# Altium footprint library 2.54插件排母.PcbLib: 74 footprints (part 5 of 5)
Each footprint in its own frame and in the unit in brackets; x right, y up, seen from the top. Pads: shape width x height; smd on the part's side, far side on the other; paste and mask are expansions set on the pad; w line width, h text height; cw(c..) or ccw(c..) is an arc to the next point about the centre after c.
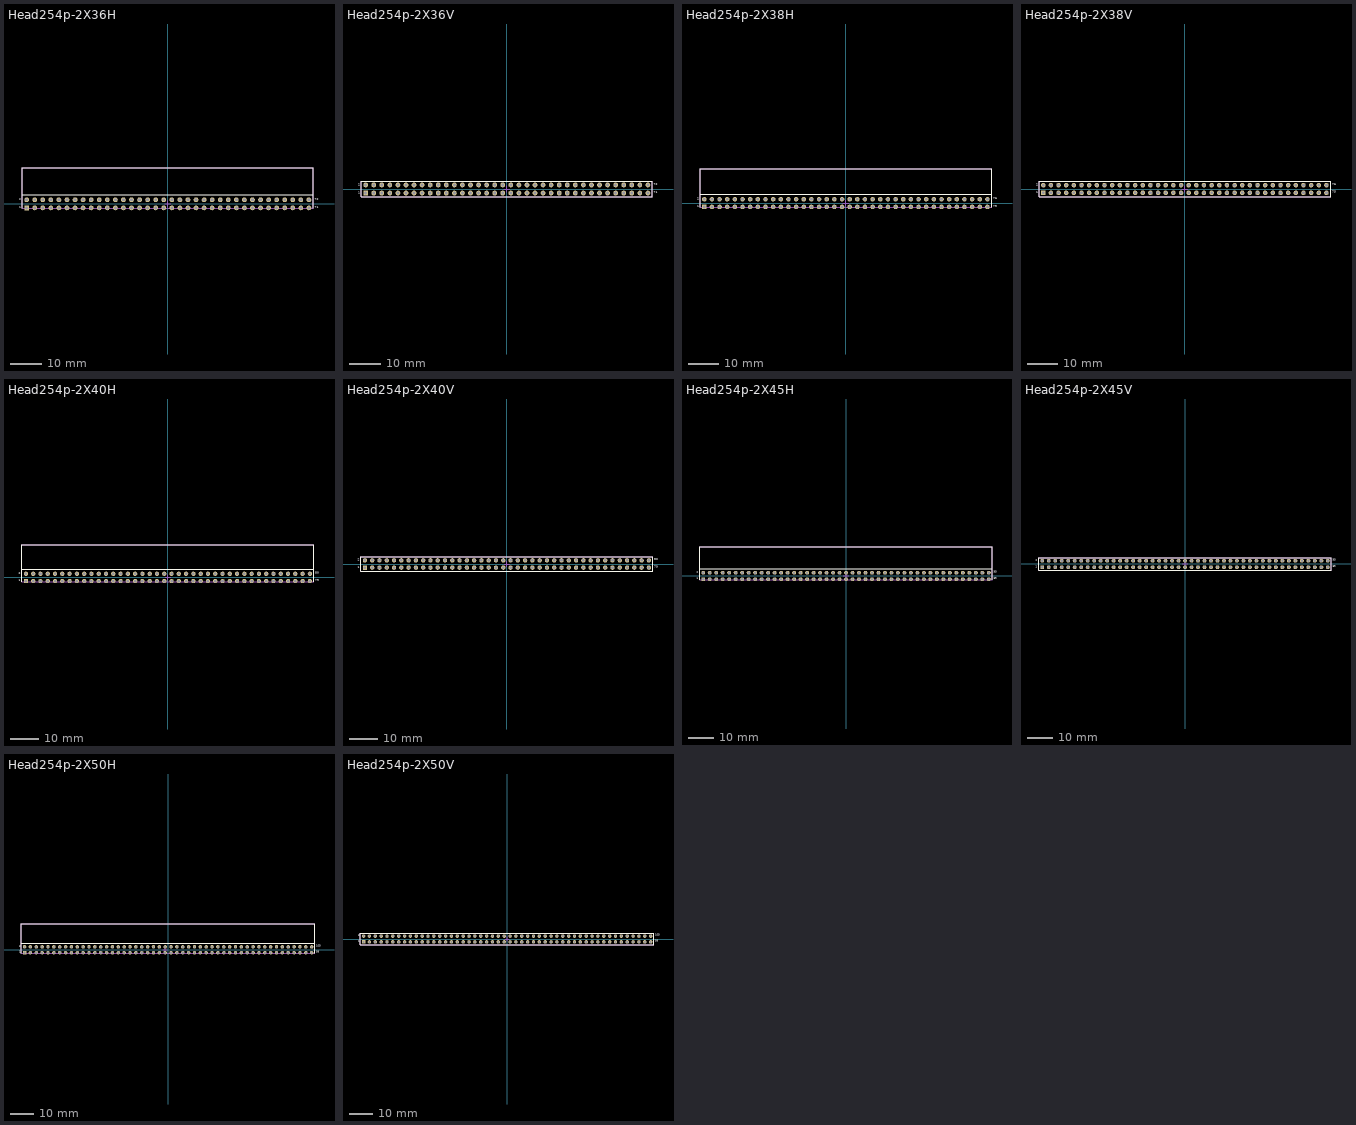
[diagram p4: the footprints below, top view; thin cyan lines are the x and y axes]

## Head254p-2X36H [mm] "2.54脚距 90度 插件 双排母"
height 5
pads (72):
  rect 1.5x1.5 hole 0.9: 1(-44.45,-1.27)
  round 1.5 hole 0.9: 2(-44.45,1.27) 3(-41.91,-1.27) 4(-41.91,1.27) 5(-39.37,-1.27) 6(-39.37,1.27) 7(-36.83,-1.27) 8(-36.83,1.27) 9(-34.29,-1.27) 10(-34.29,1.27) 11(-31.75,-1.27) 12(-31.75,1.27) 13(-29.21,-1.27) 14(-29.21,1.27) 15(-26.67,-1.27) 16(-26.67,1.27) 17(-24.13,-1.27) 18(-24.13,1.27) 19(-21.59,-1.27) 20(-21.59,1.27) 21(-19.05,-1.27) 22(-19.05,1.27) 23(-16.51,-1.27) 24(-16.51,1.27) 25(-13.97,-1.27) 26(-13.97,1.27) 27(-11.43,-1.27) 28(-11.43,1.27) 29(-8.89,-1.27) 30(-8.89,1.27) 31(-6.35,-1.27) 32(-6.35,1.27) 33(-3.81,-1.27) 34(-3.81,1.27) 35(-1.27,-1.27) 36(-1.27,1.27) 37(1.27,-1.27) 38(1.27,1.27) 39(3.81,-1.27) 40(3.81,1.27) 41(6.35,-1.27) 42(6.35,1.27) 43(8.89,-1.27) 44(8.89,1.27) 45(11.43,-1.27) 46(11.43,1.27) 47(13.97,-1.27) 48(13.97,1.27) 49(16.51,-1.27) 50(16.51,1.27) 51(19.05,-1.27) 52(19.05,1.27) 53(21.59,-1.27) 54(21.59,1.27) 55(24.13,-1.27) 56(24.13,1.27) 57(26.67,-1.27) 58(26.67,1.27) 59(29.21,-1.27) 60(29.21,1.27) 61(31.75,-1.27) 62(31.75,1.27) 63(34.29,-1.27) 64(34.29,1.27) 65(36.83,-1.27) 66(36.83,1.27) 67(39.37,-1.27) 68(39.37,1.27) 69(41.91,-1.27) 70(41.91,1.27) 71(44.45,-1.27) 72(44.45,1.27)
Top Overlay:
  lines w0.254: -45.82,-1.43 -45.82,11.37 45.82,11.37 45.82,-1.43 ; -45.82,2.87 45.82,2.87
  text "2" at -46.863,0.762 h1.27
  text "1" at -46.863,-1.778 h1.27
  text "71" at 46.355,-1.651 h1.27
  text "72" at 46.355,0.889 h1.27
Mechanical 13:
  lines w0.1: -45.82,-1.43 -45.82,11.37 45.82,11.37 45.82,-1.43 -45.82,-1.43
Mechanical 15:
  lines w0.1: -1,0 1,0 ; 0,-1 0,1
3D body: height 5.04, standoff -2.35, extent -45.82,-1.43 45.82,11.37

## Head254p-2X36V [mm] "2.54脚距 180度 插件 双排母"
height 9
pads (72):
  rect 1.5x1.5 hole 0.9: 1(-44.45,-1.27)
  round 1.5 hole 0.9: 2(-44.45,1.27) 3(-41.91,-1.27) 4(-41.91,1.27) 5(-39.37,-1.27) 6(-39.37,1.27) 7(-36.83,-1.27) 8(-36.83,1.27) 9(-34.29,-1.27) 10(-34.29,1.27) 11(-31.75,-1.27) 12(-31.75,1.27) 13(-29.21,-1.27) 14(-29.21,1.27) 15(-26.67,-1.27) 16(-26.67,1.27) 17(-24.13,-1.27) 18(-24.13,1.27) 19(-21.59,-1.27) 20(-21.59,1.27) 21(-19.05,-1.27) 22(-19.05,1.27) 23(-16.51,-1.27) 24(-16.51,1.27) 25(-13.97,-1.27) 26(-13.97,1.27) 27(-11.43,-1.27) 28(-11.43,1.27) 29(-8.89,-1.27) 30(-8.89,1.27) 31(-6.35,-1.27) 32(-6.35,1.27) 33(-3.81,-1.27) 34(-3.81,1.27) 35(-1.27,-1.27) 36(-1.27,1.27) 37(1.27,-1.27) 38(1.27,1.27) 39(3.81,-1.27) 40(3.81,1.27) 41(6.35,-1.27) 42(6.35,1.27) 43(8.89,-1.27) 44(8.89,1.27) 45(11.43,-1.27) 46(11.43,1.27) 47(13.97,-1.27) 48(13.97,1.27) 49(16.51,-1.27) 50(16.51,1.27) 51(19.05,-1.27) 52(19.05,1.27) 53(21.59,-1.27) 54(21.59,1.27) 55(24.13,-1.27) 56(24.13,1.27) 57(26.67,-1.27) 58(26.67,1.27) 59(29.21,-1.27) 60(29.21,1.27) 61(31.75,-1.27) 62(31.75,1.27) 63(34.29,-1.27) 64(34.29,1.27) 65(36.83,-1.27) 66(36.83,1.27) 67(39.37,-1.27) 68(39.37,1.27) 69(41.91,-1.27) 70(41.91,1.27) 71(44.45,-1.27) 72(44.45,1.27)
Top Overlay:
  lines w0.2: -45.82,-2.5 45.82,-2.5 45.82,2.5 -45.82,2.5 -45.82,-2.5
  text "2" at -46.863,0.762 h1.27
  text "1" at -46.863,-1.778 h1.27
  text "71" at 46.355,-1.651 h1.27
  text "72" at 46.355,0.889 h1.27
Mechanical 13:
  lines w0.1: -45.82,-2.5 -45.82,2.5 45.82,2.5 45.82,-2.5 -45.82,-2.5
Mechanical 15:
  lines w0.1: -1,0 1,0 ; 0,-1 0,1
3D body: height 8.5, standoff -3, extent -45.82,-2.5 45.82,2.5

## Head254p-2X38H [mm] "2.54脚距 90度 插件 双排母"
height 5
pads (76):
  rect 1.5x1.5 hole 0.9: 1(-46.99,-1.27)
  round 1.5 hole 0.9: 2(-46.99,1.27) 3(-44.45,-1.27) 4(-44.45,1.27) 5(-41.91,-1.27) 6(-41.91,1.27) 7(-39.37,-1.27) 8(-39.37,1.27) 9(-36.83,-1.27) 10(-36.83,1.27) 11(-34.29,-1.27) 12(-34.29,1.27) 13(-31.75,-1.27) 14(-31.75,1.27) 15(-29.21,-1.27) 16(-29.21,1.27) 17(-26.67,-1.27) 18(-26.67,1.27) 19(-24.13,-1.27) 20(-24.13,1.27) 21(-21.59,-1.27) 22(-21.59,1.27) 23(-19.05,-1.27) 24(-19.05,1.27) 25(-16.51,-1.27) 26(-16.51,1.27) 27(-13.97,-1.27) 28(-13.97,1.27) 29(-11.43,-1.27) 30(-11.43,1.27) 31(-8.89,-1.27) 32(-8.89,1.27) 33(-6.35,-1.27) 34(-6.35,1.27) 35(-3.81,-1.27) 36(-3.81,1.27) 37(-1.27,-1.27) 38(-1.27,1.27) 39(1.27,-1.27) 40(1.27,1.27) 41(3.81,-1.27) 42(3.81,1.27) 43(6.35,-1.27) 44(6.35,1.27) 45(8.89,-1.27) 46(8.89,1.27) 47(11.43,-1.27) 48(11.43,1.27) 49(13.97,-1.27) 50(13.97,1.27) 51(16.51,-1.27) 52(16.51,1.27) 53(19.05,-1.27) 54(19.05,1.27) 55(21.59,-1.27) 56(21.59,1.27) 57(24.13,-1.27) 58(24.13,1.27) 59(26.67,-1.27) 60(26.67,1.27) 61(29.21,-1.27) 62(29.21,1.27) 63(31.75,-1.27) 64(31.75,1.27) 65(34.29,-1.27) 66(34.29,1.27) 67(36.83,-1.27) 68(36.83,1.27) 69(39.37,-1.27) 70(39.37,1.27) 71(41.91,-1.27) 72(41.91,1.27) 73(44.45,-1.27) 74(44.45,1.27) 75(46.99,-1.27) 76(46.99,1.27)
Top Overlay:
  lines w0.254: -48.36,-1.43 -48.36,11.37 48.36,11.37 48.36,-1.43 ; -48.36,2.87 48.36,2.87
  text "2" at -49.403,0.762 h1.27
  text "1" at -49.403,-1.778 h1.27
  text "75" at 48.895,-1.651 h1.27
  text "76" at 48.895,0.889 h1.27
Mechanical 13:
  lines w0.1: -48.36,-1.43 -48.36,11.37 48.36,11.37 48.36,-1.43 -48.36,-1.43
Mechanical 15:
  lines w0.1: -1,0 1,0 ; 0,-1 0,1
3D body: height 5.04, standoff -2.35, extent -48.36,-1.43 48.36,11.37

## Head254p-2X38V [mm] "2.54脚距 180度 插件 双排母"
height 9
pads (76):
  rect 1.5x1.5 hole 0.9: 1(-46.99,-1.27)
  round 1.5 hole 0.9: 2(-46.99,1.27) 3(-44.45,-1.27) 4(-44.45,1.27) 5(-41.91,-1.27) 6(-41.91,1.27) 7(-39.37,-1.27) 8(-39.37,1.27) 9(-36.83,-1.27) 10(-36.83,1.27) 11(-34.29,-1.27) 12(-34.29,1.27) 13(-31.75,-1.27) 14(-31.75,1.27) 15(-29.21,-1.27) 16(-29.21,1.27) 17(-26.67,-1.27) 18(-26.67,1.27) 19(-24.13,-1.27) 20(-24.13,1.27) 21(-21.59,-1.27) 22(-21.59,1.27) 23(-19.05,-1.27) 24(-19.05,1.27) 25(-16.51,-1.27) 26(-16.51,1.27) 27(-13.97,-1.27) 28(-13.97,1.27) 29(-11.43,-1.27) 30(-11.43,1.27) 31(-8.89,-1.27) 32(-8.89,1.27) 33(-6.35,-1.27) 34(-6.35,1.27) 35(-3.81,-1.27) 36(-3.81,1.27) 37(-1.27,-1.27) 38(-1.27,1.27) 39(1.27,-1.27) 40(1.27,1.27) 41(3.81,-1.27) 42(3.81,1.27) 43(6.35,-1.27) 44(6.35,1.27) 45(8.89,-1.27) 46(8.89,1.27) 47(11.43,-1.27) 48(11.43,1.27) 49(13.97,-1.27) 50(13.97,1.27) 51(16.51,-1.27) 52(16.51,1.27) 53(19.05,-1.27) 54(19.05,1.27) 55(21.59,-1.27) 56(21.59,1.27) 57(24.13,-1.27) 58(24.13,1.27) 59(26.67,-1.27) 60(26.67,1.27) 61(29.21,-1.27) 62(29.21,1.27) 63(31.75,-1.27) 64(31.75,1.27) 65(34.29,-1.27) 66(34.29,1.27) 67(36.83,-1.27) 68(36.83,1.27) 69(39.37,-1.27) 70(39.37,1.27) 71(41.91,-1.27) 72(41.91,1.27) 73(44.45,-1.27) 74(44.45,1.27) 75(46.99,-1.27) 76(46.99,1.27)
Top Overlay:
  lines w0.2: -48.36,-2.5 -48.36,2.5 48.36,2.5 48.36,-2.5 -48.36,-2.5
  text "1" at -49.403,-1.778 h1.27
  text "2" at -49.403,0.762 h1.27
  text "76" at 48.895,0.889 h1.27
  text "75" at 48.895,-1.651 h1.27
Mechanical 13:
  lines w0.1: -48.36,-2.5 48.36,-2.5 48.36,2.5 -48.36,2.5 -48.36,-2.5
Mechanical 15:
  lines w0.1: -1,0 1,0 ; 0,-1 0,1
3D body: height 8.5, standoff -3, extent -48.36,-2.5 48.36,2.5

## Head254p-2X40H [mm] "2.54脚距 90度 插件 双排母"
height 5
pads (80):
  rect 1.5x1.5 hole 0.9: 1(-49.53,-1.27)
  round 1.5 hole 0.9: 2(-49.53,1.27) 3(-46.99,-1.27) 4(-46.99,1.27) 5(-44.45,-1.27) 6(-44.45,1.27) 7(-41.91,-1.27) 8(-41.91,1.27) 9(-39.37,-1.27) 10(-39.37,1.27) 11(-36.83,-1.27) 12(-36.83,1.27) 13(-34.29,-1.27) 14(-34.29,1.27) 15(-31.75,-1.27) 16(-31.75,1.27) 17(-29.21,-1.27) 18(-29.21,1.27) 19(-26.67,-1.27) 20(-26.67,1.27) 21(-24.13,-1.27) 22(-24.13,1.27) 23(-21.59,-1.27) 24(-21.59,1.27) 25(-19.05,-1.27) 26(-19.05,1.27) 27(-16.51,-1.27) 28(-16.51,1.27) 29(-13.97,-1.27) 30(-13.97,1.27) 31(-11.43,-1.27) 32(-11.43,1.27) 33(-8.89,-1.27) 34(-8.89,1.27) 35(-6.35,-1.27) 36(-6.35,1.27) 37(-3.81,-1.27) 38(-3.81,1.27) 39(-1.27,-1.27) 40(-1.27,1.27) 41(1.27,-1.27) 42(1.27,1.27) 43(3.81,-1.27) 44(3.81,1.27) 45(6.35,-1.27) 46(6.35,1.27) 47(8.89,-1.27) 48(8.89,1.27) 49(11.43,-1.27) 50(11.43,1.27) 51(13.97,-1.27) 52(13.97,1.27) 53(16.51,-1.27) 54(16.51,1.27) 55(19.05,-1.27) 56(19.05,1.27) 57(21.59,-1.27) 58(21.59,1.27) 59(24.13,-1.27) 60(24.13,1.27) 61(26.67,-1.27) 62(26.67,1.27) 63(29.21,-1.27) 64(29.21,1.27) 65(31.75,-1.27) 66(31.75,1.27) 67(34.29,-1.27) 68(34.29,1.27) 69(36.83,-1.27) 70(36.83,1.27) 71(39.37,-1.27) 72(39.37,1.27) 73(41.91,-1.27) 74(41.91,1.27) 75(44.45,-1.27) 76(44.45,1.27) 77(46.99,-1.27) 78(46.99,1.27) 79(49.53,-1.27) 80(49.53,1.27)
Top Overlay:
  lines w0.254: -50.9,-1.43 -50.9,11.37 50.9,11.37 50.9,-1.43 ; -50.9,2.87 50.9,2.87
  text "2" at -51.943,0.762 h1.27
  text "1" at -51.943,-1.778 h1.27
  text "79" at 51.435,-1.651 h1.27
  text "80" at 51.435,0.889 h1.27
Mechanical 13:
  lines w0.1: -50.9,-1.43 -50.9,11.37 50.9,11.37 50.9,-1.43 -50.9,-1.43
Mechanical 15:
  lines w0.1: -1,0 1,0 ; 0,-1 0,1
3D body: height 5.04, standoff -2.35, extent -50.9,-1.43 50.9,11.37

## Head254p-2X40V [mm] "2.54脚距 180度 插件 双排母"
height 9
pads (80):
  rect 1.5x1.5 hole 0.9: 1(-49.53,-1.27)
  round 1.5 hole 0.9: 2(-49.53,1.27) 3(-46.99,-1.27) 4(-46.99,1.27) 5(-44.45,-1.27) 6(-44.45,1.27) 7(-41.91,-1.27) 8(-41.91,1.27) 9(-39.37,-1.27) 10(-39.37,1.27) 11(-36.83,-1.27) 12(-36.83,1.27) 13(-34.29,-1.27) 14(-34.29,1.27) 15(-31.75,-1.27) 16(-31.75,1.27) 17(-29.21,-1.27) 18(-29.21,1.27) 19(-26.67,-1.27) 20(-26.67,1.27) 21(-24.13,-1.27) 22(-24.13,1.27) 23(-21.59,-1.27) 24(-21.59,1.27) 25(-19.05,-1.27) 26(-19.05,1.27) 27(-16.51,-1.27) 28(-16.51,1.27) 29(-13.97,-1.27) 30(-13.97,1.27) 31(-11.43,-1.27) 32(-11.43,1.27) 33(-8.89,-1.27) 34(-8.89,1.27) 35(-6.35,-1.27) 36(-6.35,1.27) 37(-3.81,-1.27) 38(-3.81,1.27) 39(-1.27,-1.27) 40(-1.27,1.27) 41(1.27,-1.27) 42(1.27,1.27) 43(3.81,-1.27) 44(3.81,1.27) 45(6.35,-1.27) 46(6.35,1.27) 47(8.89,-1.27) 48(8.89,1.27) 49(11.43,-1.27) 50(11.43,1.27) 51(13.97,-1.27) 52(13.97,1.27) 53(16.51,-1.27) 54(16.51,1.27) 55(19.05,-1.27) 56(19.05,1.27) 57(21.59,-1.27) 58(21.59,1.27) 59(24.13,-1.27) 60(24.13,1.27) 61(26.67,-1.27) 62(26.67,1.27) 63(29.21,-1.27) 64(29.21,1.27) 65(31.75,-1.27) 66(31.75,1.27) 67(34.29,-1.27) 68(34.29,1.27) 69(36.83,-1.27) 70(36.83,1.27) 71(39.37,-1.27) 72(39.37,1.27) 73(41.91,-1.27) 74(41.91,1.27) 75(44.45,-1.27) 76(44.45,1.27) 77(46.99,-1.27) 78(46.99,1.27) 79(49.53,-1.27) 80(49.53,1.27)
Top Overlay:
  lines w0.2: -50.9,-2.5 50.9,-2.5 50.9,2.5 -50.9,2.5 -50.9,-2.5
  text "79" at 51.435,-1.651 h1.27
  text "80" at 51.435,0.889 h1.27
  text "2" at -51.943,0.762 h1.27
  text "1" at -51.943,-1.778 h1.27
Mechanical 13:
  lines w0.1: -50.9,-2.5 -50.9,2.5 50.9,2.5 50.9,-2.5 -50.9,-2.5
Mechanical 15:
  lines w0.1: -1,0 1,0 ; 0,-1 0,1
3D body: height 8.5, standoff -3, extent -50.9,-2.5 50.9,2.5

## Head254p-2X45H [mm] "2.54脚距 90度 插件 双排母"
height 5
pads (90):
  rect 1.5x1.5 hole 0.9: 1(-55.88,-1.27)
  round 1.5 hole 0.9: 2(-55.88,1.27) 3(-53.34,-1.27) 4(-53.34,1.27) 5(-50.8,-1.27) 6(-50.8,1.27) 7(-48.26,-1.27) 8(-48.26,1.27) 9(-45.72,-1.27) 10(-45.72,1.27) 11(-43.18,-1.27) 12(-43.18,1.27) 13(-40.64,-1.27) 14(-40.64,1.27) 15(-38.1,-1.27) 16(-38.1,1.27) 17(-35.56,-1.27) 18(-35.56,1.27) 19(-33.02,-1.27) 20(-33.02,1.27) 21(-30.48,-1.27) 22(-30.48,1.27) 23(-27.94,-1.27) 24(-27.94,1.27) 25(-25.4,-1.27) 26(-25.4,1.27) 27(-22.86,-1.27) 28(-22.86,1.27) 29(-20.32,-1.27) 30(-20.32,1.27) 31(-17.78,-1.27) 32(-17.78,1.27) 33(-15.24,-1.27) 34(-15.24,1.27) 35(-12.7,-1.27) 36(-12.7,1.27) 37(-10.16,-1.27) 38(-10.16,1.27) 39(-7.62,-1.27) 40(-7.62,1.27) 41(-5.08,-1.27) 42(-5.08,1.27) 43(-2.54,-1.27) 44(-2.54,1.27) 45(0,-1.27) 46(0,1.27) 47(2.54,-1.27) 48(2.54,1.27) 49(5.08,-1.27) 50(5.08,1.27) 51(7.62,-1.27) 52(7.62,1.27) 53(10.16,-1.27) 54(10.16,1.27) 55(12.7,-1.27) 56(12.7,1.27) 57(15.24,-1.27) 58(15.24,1.27) 59(17.78,-1.27) 60(17.78,1.27) 61(20.32,-1.27) 62(20.32,1.27) 63(22.86,-1.27) 64(22.86,1.27) 65(25.4,-1.27) 66(25.4,1.27) 67(27.94,-1.27) 68(27.94,1.27) 69(30.48,-1.27) 70(30.48,1.27) 71(33.02,-1.27) 72(33.02,1.27) 73(35.56,-1.27) 74(35.56,1.27) 75(38.1,-1.27) 76(38.1,1.27) 77(40.64,-1.27) 78(40.64,1.27) 79(43.18,-1.27) 80(43.18,1.27) 81(45.72,-1.27) 82(45.72,1.27) 83(48.26,-1.27) 84(48.26,1.27) 85(50.8,-1.27) 86(50.8,1.27) 87(53.34,-1.27) 88(53.34,1.27) 89(55.88,-1.27) 90(55.88,1.27)
Top Overlay:
  lines w0.254: -57.25,-1.43 -57.25,11.37 57.25,11.37 57.25,-1.43 ; -57.25,2.87 57.25,2.87
  text "2" at -58.293,0.762 h1.27
  text "1" at -58.293,-1.778 h1.27
  text "89" at 57.785,-1.651 h1.27
  text "90" at 57.785,0.889 h1.27
Mechanical 13:
  lines w0.1: -57.25,-1.43 -57.25,11.37 57.25,11.37 57.25,-1.43 -57.25,-1.43
Mechanical 15:
  lines w0.1: -1,0 1,0 ; 0,-1 0,1
3D body: height 5.04, standoff -2.35, extent -57.25,-1.43 57.25,11.37

## Head254p-2X45V [mm] "2.54脚距 180度 插件 双排母"
height 9
pads (90):
  rect 1.5x1.5 hole 0.9: 1(-55.88,-1.27)
  round 1.5 hole 0.9: 2(-55.88,1.27) 3(-53.34,-1.27) 4(-53.34,1.27) 5(-50.8,-1.27) 6(-50.8,1.27) 7(-48.26,-1.27) 8(-48.26,1.27) 9(-45.72,-1.27) 10(-45.72,1.27) 11(-43.18,-1.27) 12(-43.18,1.27) 13(-40.64,-1.27) 14(-40.64,1.27) 15(-38.1,-1.27) 16(-38.1,1.27) 17(-35.56,-1.27) 18(-35.56,1.27) 19(-33.02,-1.27) 20(-33.02,1.27) 21(-30.48,-1.27) 22(-30.48,1.27) 23(-27.94,-1.27) 24(-27.94,1.27) 25(-25.4,-1.27) 26(-25.4,1.27) 27(-22.86,-1.27) 28(-22.86,1.27) 29(-20.32,-1.27) 30(-20.32,1.27) 31(-17.78,-1.27) 32(-17.78,1.27) 33(-15.24,-1.27) 34(-15.24,1.27) 35(-12.7,-1.27) 36(-12.7,1.27) 37(-10.16,-1.27) 38(-10.16,1.27) 39(-7.62,-1.27) 40(-7.62,1.27) 41(-5.08,-1.27) 42(-5.08,1.27) 43(-2.54,-1.27) 44(-2.54,1.27) 45(0,-1.27) 46(0,1.27) 47(2.54,-1.27) 48(2.54,1.27) 49(5.08,-1.27) 50(5.08,1.27) 51(7.62,-1.27) 52(7.62,1.27) 53(10.16,-1.27) 54(10.16,1.27) 55(12.7,-1.27) 56(12.7,1.27) 57(15.24,-1.27) 58(15.24,1.27) 59(17.78,-1.27) 60(17.78,1.27) 61(20.32,-1.27) 62(20.32,1.27) 63(22.86,-1.27) 64(22.86,1.27) 65(25.4,-1.27) 66(25.4,1.27) 67(27.94,-1.27) 68(27.94,1.27) 69(30.48,-1.27) 70(30.48,1.27) 71(33.02,-1.27) 72(33.02,1.27) 73(35.56,-1.27) 74(35.56,1.27) 75(38.1,-1.27) 76(38.1,1.27) 77(40.64,-1.27) 78(40.64,1.27) 79(43.18,-1.27) 80(43.18,1.27) 81(45.72,-1.27) 82(45.72,1.27) 83(48.26,-1.27) 84(48.26,1.27) 85(50.8,-1.27) 86(50.8,1.27) 87(53.34,-1.27) 88(53.34,1.27) 89(55.88,-1.27) 90(55.88,1.27)
Top Overlay:
  lines w0.2: -57.25,-2.5 -57.25,2.5 57.25,2.5 57.25,-2.5 -57.25,-2.5
  text "89" at 57.785,-1.651 h1.27
  text "90" at 57.785,0.889 h1.27
  text "1" at -58.293,-1.778 h1.27
  text "2" at -58.293,0.762 h1.27
Mechanical 13:
  lines w0.1: -57.25,-2.5 57.25,-2.5 57.25,2.5 -57.25,2.5 -57.25,-2.5
Mechanical 15:
  lines w0.1: -1,0 1,0 ; 0,-1 0,1
3D body: height 8.5, standoff -3, extent -57.25,-2.5 57.25,2.5

## Head254p-2X50H [mm] "2.54脚距 90度 插件 双排母"
height 5
pads (100):
  rect 1.5x1.5 hole 0.9: 1(-62.23,-1.27)
  round 1.5 hole 0.9: 2(-62.23,1.27) 3(-59.69,-1.27) 4(-59.69,1.27) 5(-57.15,-1.27) 6(-57.15,1.27) 7(-54.61,-1.27) 8(-54.61,1.27) 9(-52.07,-1.27) 10(-52.07,1.27) 11(-49.53,-1.27) 12(-49.53,1.27) 13(-46.99,-1.27) 14(-46.99,1.27) 15(-44.45,-1.27) 16(-44.45,1.27) 17(-41.91,-1.27) 18(-41.91,1.27) 19(-39.37,-1.27) 20(-39.37,1.27) 21(-36.83,-1.27) 22(-36.83,1.27) 23(-34.29,-1.27) 24(-34.29,1.27) 25(-31.75,-1.27) 26(-31.75,1.27) 27(-29.21,-1.27) 28(-29.21,1.27) 29(-26.67,-1.27) 30(-26.67,1.27) 31(-24.13,-1.27) 32(-24.13,1.27) 33(-21.59,-1.27) 34(-21.59,1.27) 35(-19.05,-1.27) 36(-19.05,1.27) 37(-16.51,-1.27) 38(-16.51,1.27) 39(-13.97,-1.27) 40(-13.97,1.27) 41(-11.43,-1.27) 42(-11.43,1.27) 43(-8.89,-1.27) 44(-8.89,1.27) 45(-6.35,-1.27) 46(-6.35,1.27) 47(-3.81,-1.27) 48(-3.81,1.27) 49(-1.27,-1.27) 50(-1.27,1.27) 51(1.27,-1.27) 52(1.27,1.27) 53(3.81,-1.27) 54(3.81,1.27) 55(6.35,-1.27) 56(6.35,1.27) 57(8.89,-1.27) 58(8.89,1.27) 59(11.43,-1.27) 60(11.43,1.27) 61(13.97,-1.27) 62(13.97,1.27) 63(16.51,-1.27) 64(16.51,1.27) 65(19.05,-1.27) 66(19.05,1.27) 67(21.59,-1.27) 68(21.59,1.27) 69(24.13,-1.27) 70(24.13,1.27) 71(26.67,-1.27) 72(26.67,1.27) 73(29.21,-1.27) 74(29.21,1.27) 75(31.75,-1.27) 76(31.75,1.27) 77(34.29,-1.27) 78(34.29,1.27) 79(36.83,-1.27) 80(36.83,1.27) 81(39.37,-1.27) 82(39.37,1.27) 83(41.91,-1.27) 84(41.91,1.27) 85(44.45,-1.27) 86(44.45,1.27) 87(46.99,-1.27) 88(46.99,1.27) 89(49.53,-1.27) 90(49.53,1.27) 91(52.07,-1.27) 92(52.07,1.27) 93(54.61,-1.27) 94(54.61,1.27) 95(57.15,-1.27) 96(57.15,1.27) 97(59.69,-1.27) 98(59.69,1.27) 99(62.23,-1.27) 100(62.23,1.27)
Top Overlay:
  lines w0.254: -63.6,-1.43 -63.6,11.37 63.6,11.37 63.6,-1.43 ; -63.6,2.87 63.6,2.87
  text "2" at -64.643,0.762 h1.27
  text "1" at -64.643,-1.778 h1.27
  text "99" at 64.135,-1.651 h1.27
  text "100" at 64.135,0.889 h1.27
Mechanical 13:
  lines w0.1: -63.6,-1.43 -63.6,11.37 63.6,11.37 63.6,-1.43 -63.6,-1.43
Mechanical 15:
  lines w0.1: -2.27,0 -0.27,0 ; -1.27,-1 -1.27,1
3D body: height 5.04, standoff -2.35, extent -63.6,-1.43 63.6,11.37

## Head254p-2X50V [mm] "2.54脚距 180度 插件 双排母"
height 9
pads (100):
  rect 1.5x1.5 hole 0.9: 1(-62.23,-1.27)
  round 1.5 hole 0.9: 2(-62.23,1.27) 3(-59.69,-1.27) 4(-59.69,1.27) 5(-57.15,-1.27) 6(-57.15,1.27) 7(-54.61,-1.27) 8(-54.61,1.27) 9(-52.07,-1.27) 10(-52.07,1.27) 11(-49.53,-1.27) 12(-49.53,1.27) 13(-46.99,-1.27) 14(-46.99,1.27) 15(-44.45,-1.27) 16(-44.45,1.27) 17(-41.91,-1.27) 18(-41.91,1.27) 19(-39.37,-1.27) 20(-39.37,1.27) 21(-36.83,-1.27) 22(-36.83,1.27) 23(-34.29,-1.27) 24(-34.29,1.27) 25(-31.75,-1.27) 26(-31.75,1.27) 27(-29.21,-1.27) 28(-29.21,1.27) 29(-26.67,-1.27) 30(-26.67,1.27) 31(-24.13,-1.27) 32(-24.13,1.27) 33(-21.59,-1.27) 34(-21.59,1.27) 35(-19.05,-1.27) 36(-19.05,1.27) 37(-16.51,-1.27) 38(-16.51,1.27) 39(-13.97,-1.27) 40(-13.97,1.27) 41(-11.43,-1.27) 42(-11.43,1.27) 43(-8.89,-1.27) 44(-8.89,1.27) 45(-6.35,-1.27) 46(-6.35,1.27) 47(-3.81,-1.27) 48(-3.81,1.27) 49(-1.27,-1.27) 50(-1.27,1.27) 51(1.27,-1.27) 52(1.27,1.27) 53(3.81,-1.27) 54(3.81,1.27) 55(6.35,-1.27) 56(6.35,1.27) 57(8.89,-1.27) 58(8.89,1.27) 59(11.43,-1.27) 60(11.43,1.27) 61(13.97,-1.27) 62(13.97,1.27) 63(16.51,-1.27) 64(16.51,1.27) 65(19.05,-1.27) 66(19.05,1.27) 67(21.59,-1.27) 68(21.59,1.27) 69(24.13,-1.27) 70(24.13,1.27) 71(26.67,-1.27) 72(26.67,1.27) 73(29.21,-1.27) 74(29.21,1.27) 75(31.75,-1.27) 76(31.75,1.27) 77(34.29,-1.27) 78(34.29,1.27) 79(36.83,-1.27) 80(36.83,1.27) 81(39.37,-1.27) 82(39.37,1.27) 83(41.91,-1.27) 84(41.91,1.27) 85(44.45,-1.27) 86(44.45,1.27) 87(46.99,-1.27) 88(46.99,1.27) 89(49.53,-1.27) 90(49.53,1.27) 91(52.07,-1.27) 92(52.07,1.27) 93(54.61,-1.27) 94(54.61,1.27) 95(57.15,-1.27) 96(57.15,1.27) 97(59.69,-1.27) 98(59.69,1.27) 99(62.23,-1.27) 100(62.23,1.27)
Top Overlay:
  lines w0.2: -63.6,-2.5 63.6,-2.5 63.6,2.5 -63.6,2.5 -63.6,-2.5
  text "2" at -64.643,0.762 h1.27
  text "1" at -64.643,-1.778 h1.27
  text "99" at 64.135,-1.651 h1.27
  text "100" at 64.135,0.889 h1.27
Mechanical 13:
  lines w0.1: -63.6,-2.5 -63.6,2.5 63.6,2.5 63.6,-2.5 -63.6,-2.5
Mechanical 15:
  lines w0.1: -1,0 1,0 ; 0,-1 0,1
3D body: height 8.5, standoff -3, extent -63.6,-2.5 63.6,2.5